# Altium footprint library CADTcommon.PcbLib: 503 footprints (part 10 of 32)
Each footprint in its own frame and in the unit in brackets; x right, y up, seen from the top. Pads: shape width x height; smd on the part's side, far side on the other; paste and mask are expansions set on the pad; w line width, h text height; cw(c..) or ccw(c..) is an arc to the next point about the centre after c.
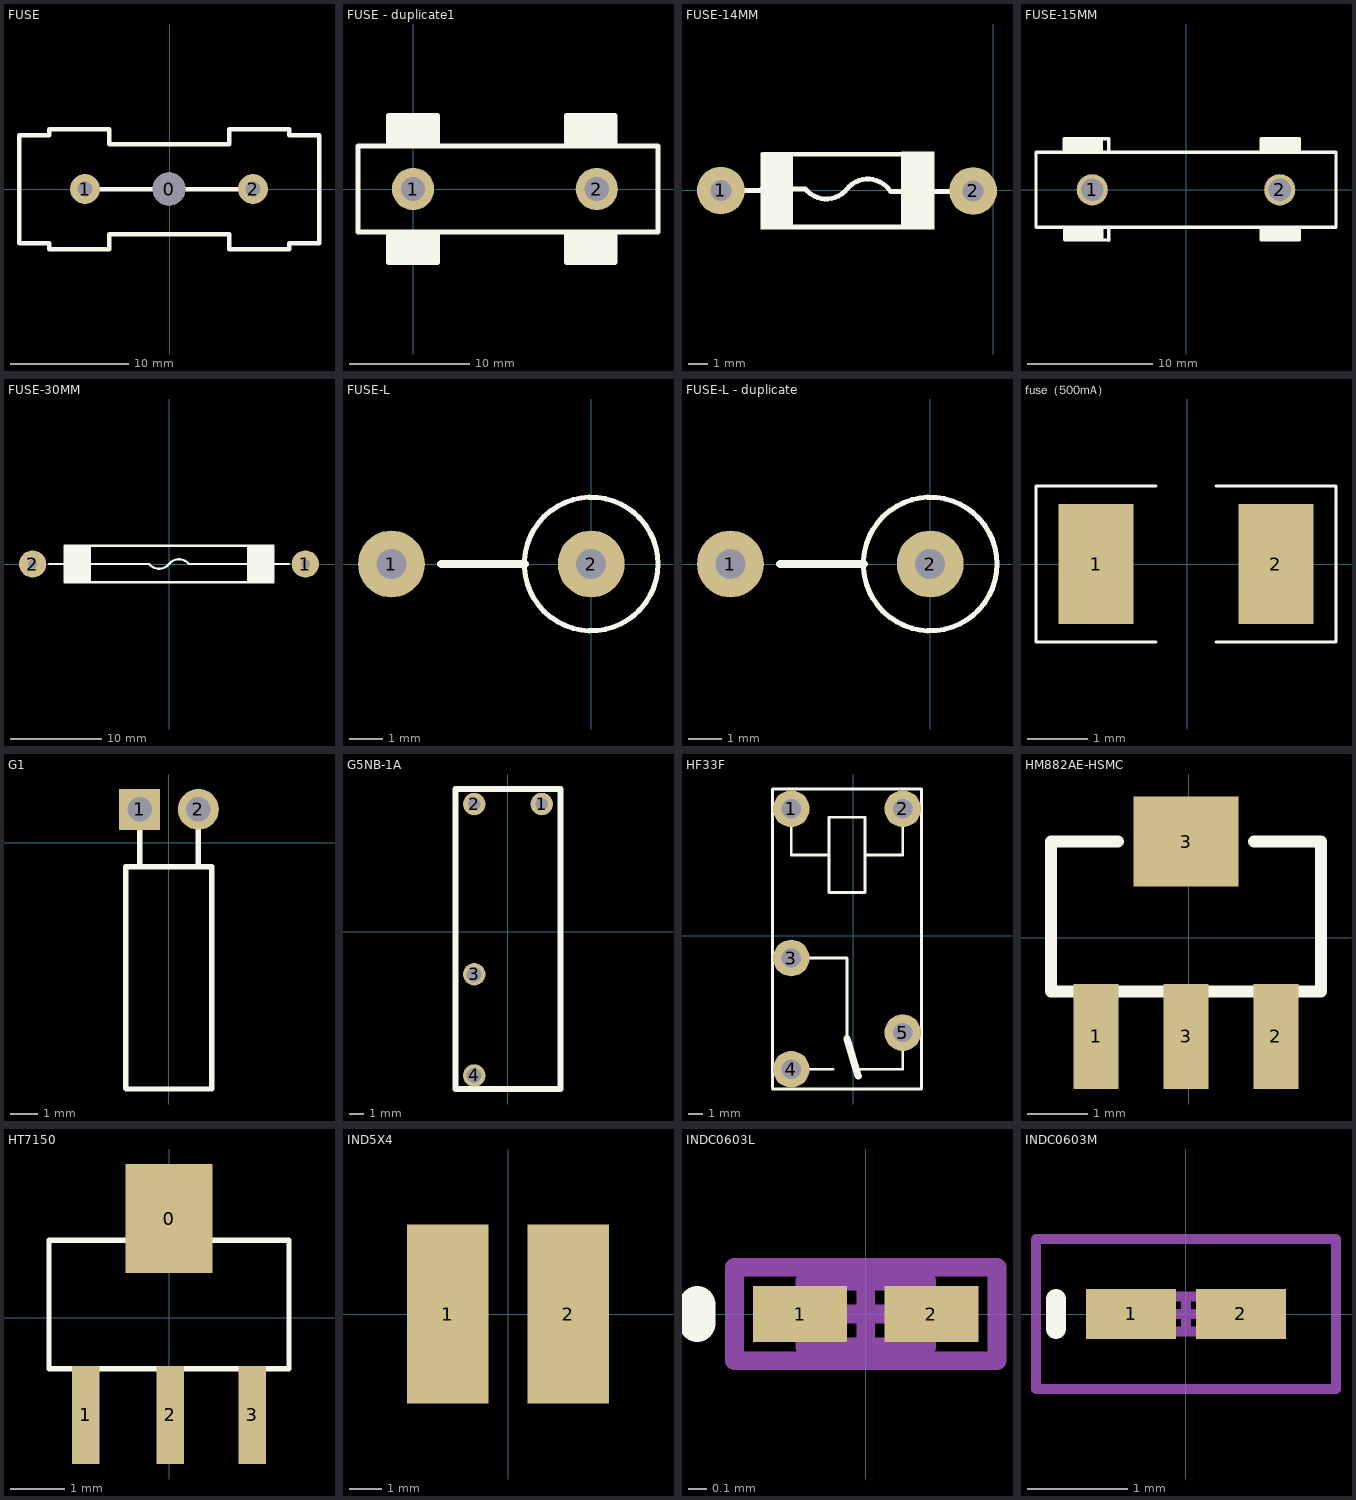
[diagram p9: the footprints below, top view; thin cyan lines are the x and y axes]

## FUSE [mil] "2A/5A"
pads (3):
  round 110 hole 110: 0(-2,1)
  round 100 hole 50: 1(-282,1) 2(278,1)
Top Overlay:
  lines w15: -282,1 278,1 ; -502,-179 -402,-179 -402,-199 -202,-199 -202,-149 198,-149 198,-199 398,-199 398,-179 498,-179 498,181 398,181 398,201 198,201 198,151 -202,151 -202,201 -402,201 -402,181 -502,181 -502,-179

## FUSE - duplicate1 [mm]
pads (2):
  round 3.5 hole 2: 1(0,0) 2(15.24,0)
Top Overlay:
  rectangle: -2.032,3.556 2.032,6.096
  rectangle: 12.7,3.556 16.764,6.096
  rectangle: -2.032,-6.096 2.032,-3.556
  rectangle: 12.7,-6.096 16.764,-3.556
  lines w0.4: -2.032,-3.556 -2.032,-6.096 2.032,-6.096 2.032,-3.556 ; -2.032,3.556 -2.032,6.096 2.032,6.096 2.032,3.556 ; 12.7,-3.556 12.7,-6.096 16.764,-6.096 16.764,-3.556 ; 12.7,3.556 12.7,6.096 16.764,6.096 16.764,4.064 16.764,3.556 ; -4.572,-3.556 -4.572,-2.54 -4.572,2.54 -4.572,3.556 20.32,3.556 20.32,-3.556 -4.572,-3.556
3D body: height 10.5, standoff -2.87, extent -4.301,-4.674 20.099,4.726
3D body: height 8.55, standoff 3.45, extent -2.152,-2.311 17.548,2.789

## FUSE-14MM [mm]
height 10
pads (2):
  round 2.5 hole 1.1: 1(-14.263,0) 2(-1.041,-0.025)
Top Overlay:
  region: -3.073,2.032 -4.826,2.032 -4.826,-2.057 -3.073,-2.057
  rectangle: -12.192,-2.057 -10.49,1.981
  lines w0.254: -13.792,0 -12.192,0 ; -12.141,0.076 -9.83,0.076 ; -12.065,1.898 -3.531,1.898 ; -11.932,-1.924 -3.734,-1.924 ; -9.83,0.069 ccw(c-8.743,0.965) -7.651,0.076 cw(c-6.559,-0.813) -5.472,0.083 ; -5.386,-0.047 -1.473,-0.049
3D body: height 4.1, standoff -1.3, extent -14.173,-1.6 -1.073,1.6

## FUSE-15MM [mm]
height 6
pads (2):
  round 2.5 hole 1.8: 1(-7.5,0) 2(7.5,0)
Top Overlay:
  rectangle: -9.666,-3.94 -6.618,-2.911
  rectangle: -9.679,3.137 -6.631,4.166
  rectangle: 6.069,-4.013 9.117,-2.984
  rectangle: 6.006,3.048 9.054,4.077
  lines w0.254: -9.742,3.061 -9.742,4.077 -6.186,4.077 -6.186,3.061 ; -9.728,-3 -9.728,-4.016 -6.172,-4.016 ; -6.186,-4.039 -6.186,-3.023 ; 6.006,-2.997 6.006,-4.013 9.054,-4.013 ; 6.006,3.048 6.006,4.077 9.054,4.077 9.054,3.048 ; 9.054,-4.026 9.054,-3.023 ; -12,-3 -12,3 12,3 12,-3 -12,-3
3D body: height 10.5, standoff -2.87, extent -12.251,-4.75 12.149,4.65
3D body: height 8.55, standoff 3.45, extent -9.373,-2.489 10.327,2.611

## FUSE-30MM [mm]
height 10
pads (2):
  round 3 hole 1: 1(15,0) 2(-15,0)
Top Overlay:
  region: 11.5,2 8.579,2 8.579,-2.025 11.5,-2.025
  rectangle: -11.5,-2.025 -8.579,2
  lines w0.254: -13.208,0 -11.684,0 ; -11.176,0 -2.179,0 ; -2.179,-0.007 ccw(c-1.092,0.889) 0,0 cw(c1.092,-0.889) 2.179,0.007 ; 2.179,0 3.607,0 ; 3.529,0.004 10.668,0 ; 11.684,0 13.208,0 ; -11.5,-2 11.5,-2 11.5,2 -11.5,2 -11.5,-2
3D body: height 5, standoff 0, extent -10.262,-2.515 9.738,2.485

## FUSE-L [mil]
height 511.81
pads (2):
  round 79 hole 35.43: 1(-236.22,0) 2(0,0)
Top Overlay:
  circle w6: c0,0 r79
  lines w10: -177.17,0 -78.74,0
3D body: height 545.04, standoff -77.66, extent -249.02,-74.21 77.68,83.27

## FUSE-L - duplicate [mil]
height 511.81
pads (2):
  round 79 hole 35.43: 1(-236.22,0) 2(0,0)
Top Overlay:
  circle w6: c0,0 r79
  lines w10: -177.17,0 -78.74,0
3D body: height 545.04, standoff -77.66, extent -249.02,-74.21 77.68,83.27

## fuse（500mA） [mm] "C1206"
pads (2):
  rect 1.25x2 smd: 1(-1.524,0) 2(1.476,0)
Top Overlay:
  lines w0.05: -0.524,-1.3 -2.524,-1.3 -2.524,1.3 -0.524,1.3 ; 0.476,-1.3 2.476,-1.3 2.476,1.3 0.476,1.3

## G1 [mm]
pads (2):
  rect 1.5x1.5 hole 0.9: 1(-1.067,1.219)
  round 1.5 hole 0.9: 2(1.092,1.219)
Top Overlay:
  lines w0.2: -1.067,-0.889 -1.067,1.219 ; 1.092,-0.889 1.092,1.219 ; -1.575,-9.017 -1.549,-9.042 1.575,-9.042 1.575,-0.889 -1.575,-0.889 -1.575,-9.017

## G5NB-1A [mil]
pads (4):
  round 60 hole 33: 1(90.39,341.02) 2(-89.61,341.02)
  round 60 hole 40: 3(-89.61,-112.98) 4(-89.61,-382.98)
Top Overlay:
  lines w15: -139.61,-418.98 140.39,-418.98 140.39,381.02 -139.61,381.02 -139.61,-418.98

## HF33F [mm]
pads (5):
  round 2.5 hole 1.3: 1(-4.249,8.672) 2(3.371,8.672) 3(-4.249,-1.528) 4(-4.249,-9.128) 5(3.371,-6.628)
Top Overlay:
  lines w0.2: -4.249,-9.128 -1.41,-9.128 ; -4.249,-1.528 -0.439,-1.528 -0.439,-7.047 ; -4.249,8.672 -4.249,5.526 -1.664,5.526 ; 0.531,-9.128 3.371,-9.128 3.371,-6.628 ; 3.371,8.672 3.371,5.526 0.785,5.526 ; -1.664,5.526 -1.664,2.96 0.785,2.96 0.785,5.526 ; -1.664,5.526 -1.664,8.091 0.785,8.091 0.785,5.526 ; -5.539,-10.478 -5.539,10.022 4.661,10.022 4.661,-10.478 -5.539,-10.478
  lines w0.5: -0.439,-7.047 0.328,-9.587

## HM882AE-HSMC [mm] "SOT89"
pads (4):
  rect 0.75x1.75 smd: 1(-1.544,-1.648) 2(1.456,-1.648) 3(-0.044,-1.648)
  rect 1.75x1.5 smd: 3(-0.044,1.602)
Top Overlay:
  lines w0.2: -1.178,1.602 -2.294,1.602 -2.294,-0.898 2.206,-0.898 2.206,1.602 1.09,1.602

## HT7150 [mm] "MYSOT89"
pads (4):
  rect 1.6x2 smd: 0(-0.001,1.822)
  rect 0.5x1.8 smd: 1(-1.525,-1.778) 2(0.024,-1.778) 3(1.523,-1.778)
Top Overlay:
  lines w0.1: -2.201,-0.928 -2.201,1.422 2.199,1.422 2.199,-0.928 -2.201,-0.928

## IND5X4 [mm]
height 4.5
pads (2):
  rect 2.5x5.5 smd: 1(-1.85,0) 2(1.85,0)
3D body: height 4.5, standoff -0.01, extent -2.857,-2.6 2.857,2.6

## INDC0603L [mm] "Chip Inductor, Body 0.6x0.3mm, IPC High Density"
height 0.35
pads (2):
  rect 0.5x0.3 smd: 1(-0.35,0) 2(0.35,0)
Top Overlay:
  lines w0.2: -0.9,-0.05 -0.9,0.05
Mechanical 13:
  lines w0.1: -0.325,-0.175 -0.325,0.175 0.325,0.175 0.325,-0.175 -0.325,-0.175
Mechanical 15:
  lines w0.1: -0.175,0 0.175,0 ; 0,-0.175 0,0.175 ; -0.7,-0.25 -0.7,0.25 0.7,0.25 0.7,-0.25 -0.7,-0.25
3D body: height 0.35, standoff 0, extent -0.325,-0.175 0.325,0.175

## INDC0603M [mm] "Chip Inductor, Body 0.6x0.3mm, IPC Low Density"
height 0.35
pads (2):
  rect 0.9x0.5 smd: 1(-0.55,0) 2(0.55,0)
Top Overlay:
  lines w0.2: -1.3,-0.15 -1.3,0.15
Mechanical 13:
  lines w0.1: -0.325,-0.175 0.325,-0.175 0.325,0.175 -0.325,0.175 -0.325,-0.175
Mechanical 15:
  lines w0.1: -0.175,0 0.175,0 ; 0,-0.175 0,0.175 ; -1.5,-0.75 1.5,-0.75 1.5,0.75 -1.5,0.75 -1.5,-0.75
3D body: height 0.35, standoff 0, extent -0.325,-0.175 0.325,0.175